# Altium footprint library Selex_PCBLib.PcbLib: 388 footprints (part 13 of 25)
Each footprint in its own frame and in the unit in brackets; x right, y up, seen from the top. Pads: shape width x height; smd on the part's side, far side on the other; paste and mask are expansions set on the pad; w line width, h text height; cw(c..) or ccw(c..) is an arc to the next point about the centre after c.
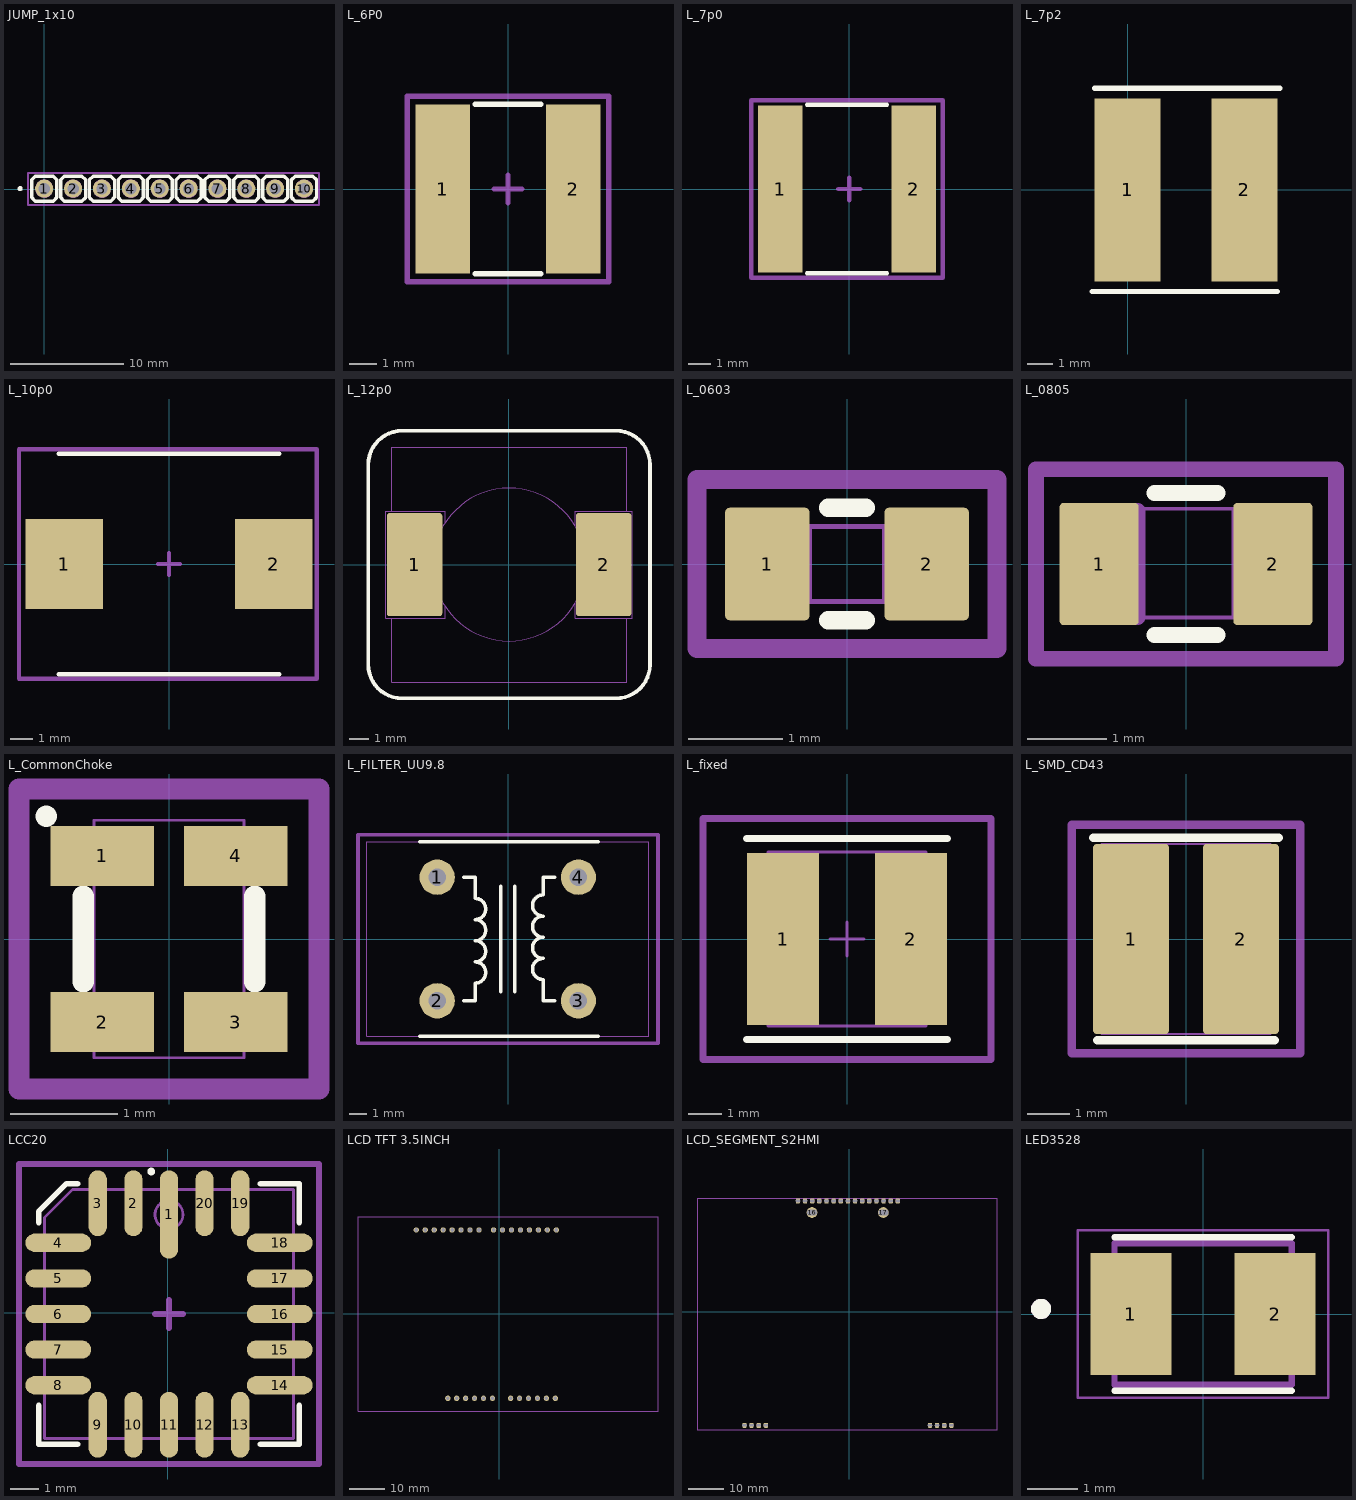
[diagram p12: the footprints below, top view; thin cyan lines are the x and y axes]

## JUMP_1x10 [mm] "JUMP_1x10_2P54"
pads (10):
  round 1.6 hole 1 mask+0.1: 1(0.02,0.03) 2(2.56,0.03) 3(5.1,0.03) 4(7.64,0.03) 5(10.18,0.03) 6(12.72,0.03) 7(15.26,0.03) 8(17.8,0.03) 9(20.34,0.03) 10(22.88,0.03)
Top Overlay:
  circle w0.254: c-2.1,0.03 r0.1
  lines w0.3: -1.08,-0.75 -1.08,0.81 -0.76,1.13 0.8,1.13 1.12,0.81 1.12,-0.75 0.8,-1.07 -0.76,-1.07 -1.08,-0.75 ; 1.46,-0.75 1.46,0.81 1.78,1.13 3.34,1.13 3.66,0.81 3.66,-0.75 3.34,-1.07 1.78,-1.07 1.46,-0.75 ; 4,-0.75 4,0.81 4.32,1.13 5.88,1.13 6.2,0.81 6.2,-0.75 5.88,-1.07 4.32,-1.07 4,-0.75 ; 6.54,-0.75 6.54,0.81 6.86,1.13 8.42,1.13 8.74,0.81 8.74,-0.75 8.42,-1.07 6.86,-1.07 6.54,-0.75 ; 9.08,-0.75 9.08,0.81 9.4,1.13 10.96,1.13 11.28,0.81 11.28,-0.75 10.96,-1.07 9.4,-1.07 9.08,-0.75 ; 11.62,-0.75 11.62,0.81 11.94,1.13 13.5,1.13 13.82,0.81 13.82,-0.75 13.5,-1.07 11.94,-1.07 11.62,-0.75 ; 14.16,-0.75 14.16,0.81 14.48,1.13 16.04,1.13 16.36,0.81 16.36,-0.75 16.04,-1.07 14.48,-1.07 14.16,-0.75 ; 16.7,-0.75 16.7,0.81 17.02,1.13 18.58,1.13 18.9,0.81 18.9,-0.75 18.58,-1.07 17.02,-1.07 16.7,-0.75 ; 19.24,-0.75 19.24,0.81 19.56,1.13 21.12,1.13 21.44,0.81 21.44,-0.75 21.12,-1.07 19.56,-1.07 19.24,-0.75 ; 21.78,-0.75 21.78,0.81 22.1,1.13 23.66,1.13 23.98,0.81 23.98,-0.75 23.66,-1.07 22.1,-1.07 21.78,-0.75
Mechanical 1:
  circle w0.05: c22.88,0.03 r0.762
  circle w0.05: c20.34,0.03 r0.762
  circle w0.05: c17.8,0.03 r0.762
  circle w0.05: c15.26,0.03 r0.762
  circle w0.05: c12.72,0.03 r0.762
  circle w0.05: c10.18,0.03 r0.762
  circle w0.05: c7.64,0.03 r0.762
  circle w0.05: c5.1,0.03 r0.762
  circle w0.05: c2.56,0.03 r0.762
  circle w0.05: c0.02,0.03 r0.762
  lines w0.05: -1.08,-0.75 -0.76,-1.07 0.8,-1.07 1.12,-0.75 1.12,0.81 0.8,1.13 -0.76,1.13 -1.08,0.81 ; 1.46,-0.75 1.78,-1.07 3.34,-1.07 3.66,-0.75 3.66,0.81 3.34,1.13 1.78,1.13 1.46,0.81 1.46,-0.75 ; 4,-0.75 4.32,-1.07 5.88,-1.07 6.2,-0.75 6.2,0.81 5.88,1.13 4.32,1.13 4,0.81 4,-0.75 ; 6.54,-0.75 6.86,-1.07 8.42,-1.07 8.74,-0.75 8.74,0.81 8.42,1.13 6.86,1.13 6.54,0.81 6.54,-0.75 ; 9.08,-0.75 9.4,-1.07 10.96,-1.07 11.28,-0.75 11.28,0.81 10.96,1.13 9.4,1.13 9.08,0.81 9.08,-0.75 ; 11.62,-0.75 11.94,-1.07 13.5,-1.07 13.82,-0.75 13.82,0.81 13.5,1.13 11.94,1.13 11.62,0.81 11.62,-0.75 ; 14.16,-0.75 14.48,-1.07 16.04,-1.07 16.36,-0.75 16.36,0.81 16.04,1.13 14.48,1.13 14.16,0.81 14.16,-0.75 ; 16.7,-0.75 17.02,-1.07 18.58,-1.07 18.9,-0.75 18.9,0.81 18.58,1.13 17.02,1.13 16.7,0.81 16.7,-0.75 ; 19.24,-0.75 19.56,-1.07 21.12,-1.07 21.44,-0.75 21.44,0.81 21.12,1.13 19.56,1.13 19.24,0.81 19.24,-0.75 ; 21.78,-0.75 22.1,-1.07 23.66,-1.07 23.98,-0.75 23.98,0.81 23.66,1.13 22.1,1.13 21.78,0.81 21.78,-0.75
  text "7" at 15.08,-0.47 h0.8
  text "5" at 9.98,-0.37 h0.8
  text "1" at -0.1,-0.37 h0.8
  text "2" at 2.3,-0.37 h0.8
  text "3" at 4.88,-0.37 h0.8
  text "4" at 7.38,-0.37 h0.8
  text "6" at 12.45,-0.42 h0.8
  text "9" at 20.08,-0.47 h0.8
  text "8" at 17.48,-1.57 h0.8
  text "10" at 22.38,-0.27 h0.6
Mechanical 15:
  lines w0.2: -1.4,-1.4 -1.4,1.4 24.2,1.4 24.2,-1.4 -1.4,-1.4
3D body "HEADER1.step": height 5.94, standoff -2.94, extent 21.58,-1.27 24.12,1.27
3D body "HEADER1.step": height 5.94, standoff -2.94, extent 19.04,-1.27 21.58,1.27
3D body "HEADER1.step": height 5.94, standoff -2.94, extent 16.5,-1.27 19.04,1.27
3D body "HEADER1.step": height 5.94, standoff -2.94, extent 13.96,-1.27 16.5,1.27
3D body "HEADER1.step": height 5.94, standoff -2.94, extent 11.42,-1.27 13.96,1.27
3D body "HEADER1.step": height 5.94, standoff -2.94, extent 8.88,-1.27 11.42,1.27
3D body "HEADER1.step": height 5.94, standoff -2.94, extent 6.34,-1.27 8.88,1.27
3D body "HEADER1.step": height 5.94, standoff -2.94, extent 3.8,-1.27 6.34,1.27
3D body "HEADER1.step": height 5.94, standoff -2.94, extent 1.26,-1.27 3.8,1.27
3D body "HEADER1.step": height 5.94, standoff -2.94, extent -1.28,-1.27 1.26,1.27

## L_6P0 [mm] "L_6P0*6P0"
pads (2):
  rect 2x6.2 smd mask+0.075: 1(-2.4,0) 2(2.4,0)
Top Overlay:
  lines w0.2: -1.2,-3.1 1.2,-3.1 ; -1.2,3.1 1.2,3.1
Mechanical 15:
  lines w0.2: -0.5,0 0.5,0 ; 0,-0.5 0,0.5 ; -3.7,-3.4 -3.7,3.4 3.7,3.4 3.7,-3.4 -3.7,-3.4
3D body "IND_TAIYO_NRS6028_TAY.step": height 2.79, standoff 0, extent -3.099,-3.101 3.099,3.101

## L_7p0 [mm] "L_7p0x8p0"
pads (2):
  rect 2x7.5 smd mask+0.075: 1(-3.1,0) 2(2.9,0)
Top Overlay:
  lines w0.2: -1.9,-3.8 1.7,-3.8 ; -1.9,3.8 1.7,3.8
Mechanical 15:
  lines w0.2: -0.5,0 0.5,0 ; 0,-0.5 0,0.5 ; -4.4,-4 4.2,-4 4.2,4 -4.4,4 -4.4,-4
3D body "SMD_Inductor_CD73.step": height 3.65, standoff -0.01, extent -4,-3.5 3.8,3.5

## L_7p2 [mm] "7.2mm x 7.2mm"
pads (2):
  rect 2.6x7.2 smd: 1(0,0) 2(4.6,0)
Top Overlay:
  lines w0.2: -1.4,-4 5.9,-4 ; -1.3,4 6,4
Internal Plane 13:
  lines w0.2: -2.018,-4.216 6.618,-4.216 6.618,4.293 -2.018,4.293 -2.018,2.54 -2.018,-4.216
3D body: height 4, standoff 0, extent -1.524,-3.81 6.096,3.81

## L_10p0 [mm] "10mm x10mm"
pads (2):
  rect 3.5x4.1 smd mask+0.075: 1(-4.75,0) 2(4.75,0)
Top Overlay:
  lines w0.2: -5,-5 5,-5 ; -5,5 5,5
Mechanical 15:
  lines w0.2: -0.5,0 0.5,0 ; 0,-0.5 0,0.5 ; -6.8,-5.2 6.7,-5.2 6.7,5.2 -2.3,5.2 -6.8,5.2 -6.8,0.7 -6.8,-5.2
3D body "CDRH104R.STEP": height 3.8, standoff 0, extent -5.05,-4.95 5.05,4.95

## L_12p0 [mm] "Inductor 12x12x8"
pads (2):
  rrect10% 2.9x5.4 smd: 1(-4.94,0.02) 2(4.96,0.02)
Top Overlay:
  lines w0.2: -7.359,-5.211 ccw(c-5.59,-5.211) -5.59,-6.98 5.61,-6.98 ccw(c5.61,-5.211) 7.379,-5.211 7.379,5.251 ccw(c5.61,5.251) 5.61,7.02 -5.59,7.02 ccw(c-5.59,5.251) -7.359,5.251 -7.359,-5.211
Internal Plane 13:
  lines w0.2: -7.9,-7.3 7.8,-7.3 7.8,7.4 -7.9,7.4 ; -7.818,-7.3 -7.818,-0.76 -7.818,7.4
Mechanical 1:
  circle w0.05: c0.01,0.02 r4
  lines w0.05: -6.14,-2.78 -6.14,-6.13 6.16,-6.13 6.16,-2.78 ; -6.14,2.82 -6.14,6.17 6.16,6.17 6.16,2.82 ; -3.34,-2.18 -3.34,-2.78 -6.44,-2.78 -6.44,2.82 -3.34,2.82 -3.34,2.22 ; 3.46,-1.98 3.46,-2.78 6.46,-2.78 6.46,2.82 3.46,2.82 3.46,2.02
3D body "inductor12x12x8.step": height 8, standoff 0, extent -5.99,-5.98 6.01,6.02

## L_0603 [mm]
pads (2):
  rrect10% 0.9x1.2 smd mask+0.1: 1(-0.85,0)
  rrect10% 0.9x1.2 smd: 2(0.85,0)
Top Overlay:
  lines w0.2: -0.2,-0.6 0.2,-0.6 ; -0.2,0.6 0.2,0.6
Mechanical 1:
  lines w0.05: -0.4,-0.4 -0.4,0.4 ; 0.4,-0.4 0.4,0.4 ; -0.8,-0.4 -0.8,0.4 0.8,0.4 0.8,-0.4 -0.8,-0.4
Mechanical 15:
  lines w0.2: -1.6,-0.9 -1.6,0.9 1.6,0.9 1.6,-0.9 -1.6,-0.9
3D body "L0603C22NJRMST.STEP": height 0.9, standoff 0.1, extent -0.8,-0.55 0.8,0.4

## L_0805 [mm] "Inductor 0805"
pads (2):
  rrect10% 1x1.55 smd mask+0.1: 1(-1.1,0) 2(1.1,0)
Top Overlay:
  lines w0.2: -0.4,-0.9 0.4,-0.9 ; -0.4,0.9 0.4,0.9
Mechanical 1:
  lines w0.05: 0.6,-0.66 0.6,0.675 ; -1.1,-0.675 -1.1,0.7 1.1,0.7 1.1,-0.675 -1.1,-0.675
  lines w0.2: -0.61,-0.675 -0.61,0.675
Mechanical 15:
  lines w0.2: -1.9,-1.2 -1.9,1.2 1.9,1.2 1.9,-1.2 -1.9,-1.2
3D body "CAP0805.step": height 0.73, standoff -0.03, extent -1,-0.655 1,0.655

## L_CommonChoke [mil] "Inductor choke"
pads (4):
  rect 38x22 smd paste+0 mask+0: 1(-24.5,30.5) 2(-24.5,-30.5) 3(24.5,-30.5) 4(24.5,30.5)
Top Overlay:
  lines w7.87: -45,44.95 ccw(c-48,45) -45,45 ; -31.5,-15.75 -31.5,15.75 ; 31.5,-15.75 31.5,15.75
Mechanical 13:
  lines w1: -27.5,-43.5 27.5,-43.5 27.5,43.5 -27.5,43.5 -27.5,-43.5
Mechanical 15:
  lines w7.87: -55,-55 55,-55 55,55 -55,55 -55,-55
3D body "IND_BOURNS_SRF2012A.step": height 55.12, standoff 0, extent -27.48,-43.5 27.48,43.51

## L_FILTER_UU9.8 [mm] "Inductor filter UU9.8"
pads (4):
  round 2 hole 1 mask+0.05: 1(-4.01,3.5) 2(-4.01,-3.5) 3(3.99,-3.5) 4(3.99,3.5)
Top Overlay:
  lines w0.2: -5,-5.5 5.1,-5.5 ; -5,5.5 5.1,5.5 ; -2.51,-3.5 -1.86,-3.5 -1.86,-2.5 ccw(c-1.86,-1.9) -1.86,-1.3 ccw(c-1.86,-0.7) -1.86,-0.1 ccw(c-1.86,0.5) -1.86,1.1 ccw(c-1.86,1.7) -1.86,2.3 -1.86,3.5 -2.51,3.5 ; -0.41,-3 -0.41,3 ; 0.39,-3 0.39,3 ; 2.64,-3.5 1.99,-3.5 1.99,-2.3 cw(c1.99,-1.7) 1.99,-1.1 cw(c1.99,-0.5) 1.99,0.1 cw(c1.99,0.7) 1.99,1.3 cw(c1.99,1.9) 1.99,2.5 1.99,3.5 2.64,3.5
Mechanical 1:
  lines w0.05: -4.01,5.5 -8.01,5.5 ; -8.01,5.5 -8.01,-5.5 7.99,-5.5 7.99,5.5 -8.01,5.5
Mechanical 15:
  lines w0.2: -8.5,-5.9 -8.5,5.9 8.5,5.9 8.5,-5.9 -8.5,-5.9
3D body "User Library-UF9_8.step": height 15.3, standoff -3, extent -8.136,-5.3 8.021,5.3

## L_fixed [mm] "inductor 3.3uH/3A, L_fixed_5P0X5P0"
pads (2):
  rect 2.15x5.15 smd: 1(-1.905,0) 2(1.905,0)
Top Overlay:
  lines w0.2: -3,-3 3,-3 ; -3,3 3,3
Mechanical 13:
  lines w0.1: -2.35,-2.587 -2.35,2.588 -2.337,2.6 2.35,2.6 2.35,-2.6 -2.337,-2.6 -2.35,-2.587
Mechanical 15:
  lines w0.1: -0.5,0 0.5,0 ; 0,-0.5 0,0.5
  lines w0.2: -4.3,-3.6 4.3,-3.6 4.3,3.6 -4.3,3.6 -4.3,-3.6
3D body: height 4, standoff 0, extent -2.25,-2.25 2.25,2.249
3D body: height 1.34, standoff 0, extent -2.35,-2.6 2.35,2.6

## L_SMD_CD43 [mm] "Inductor SMD CD43"
pads (2):
  rrect10% 1.8x4.5 smd mask+0.05: 1(-1.3,0) 2(1.3,0)
Top Overlay:
  lines w0.2: -2.2,2.4 2.2,2.4 ; -2.1,-2.4 2.1,-2.4
Mechanical 1:
  lines w0.05: -2,-2.25 2,-2.25 2,2.25 -2,2.25 -2,-2.25
Mechanical 15:
  lines w0.2: -2.7,-2.7 -2.7,2.7 2.7,2.7 2.7,-2.7 -2.7,-2.7
3D body "User Library-CD43NP.step": height 3.5, standoff 0, extent -2.388,-2.1 2.413,2.2

## LCC20 [mm] "LCC20_1P27-6P35"
pads (20):
  oval 0.65x3.15 smd: 1(0.042,3.512)
  oval 0.65x2.35 smd: 2(-1.228,3.912) 3(-2.498,3.912) 9(-2.498,-3.988) 10(-1.228,-3.988) 11(0.042,-3.988) 12(1.312,-3.988) 13(2.582,-3.988) 19(2.582,3.912) 20(1.312,3.912)
  oval 2.35x0.65 smd: 4(-3.908,2.502) 5(-3.908,1.232) 6(-3.908,-0.038) 7(-3.908,-1.308) 8(-3.908,-2.578) 14(3.992,-2.578) 15(3.992,-1.308) 16(3.992,-0.038) 17(3.992,1.232) 18(3.992,2.502)
Top Overlay:
  circle w0.25: c-0.593,5.042 r0.015
  lines w0.2: -4.608,-3.303 -4.608,-4.688 -3.223,-4.688 ; -4.608,3.227 -4.608,3.612 -3.608,4.612 -3.223,4.612 ; 3.307,-4.688 4.692,-4.688 4.692,-3.303 ; 3.307,4.612 4.692,4.612 4.692,3.227
Mechanical 13:
  circle w0.1: c0.042,3.507 r0.5
  lines w0.1: -4.403,-4.483 -4.403,3.407 -3.403,4.407 4.487,4.407 4.487,-4.483 -4.403,-4.483
Mechanical 15:
  lines w0.2: -0.458,-0.038 0.542,-0.038 ; 0.042,-0.538 0.042,0.462 ; -5.308,-5.388 -5.308,5.312 5.392,5.312 5.392,-5.388 -5.308,-5.388
3D body "User Library-AD827.STEP": height 2.5, standoff -0.05, extent -4.403,-4.483 4.487,4.407

## LCD TFT 3.5INCH [mil]
pads (28):
  round 60 hole 40.16: 1(-925.8,937.43) 2(-825.8,937.43) 3(-725.8,937.43) 4(-625.8,937.43) 5(-525.8,937.43) 6(-425.8,937.43) 7(-325.8,937.43) 8(-225.8,937.43) 9(-63.2,937.43) 10(36.8,937.43) 11(136.8,937.43) 12(236.8,937.43) 13(336.8,937.43) 14(436.8,937.43) 15(536.8,937.43) 16(636.8,937.43) 17(626.56,-940.13) 18(526.56,-940.13) 19(426.56,-940.13) 20(326.56,-940.13) 21(226.56,-940.13) 22(126.56,-940.13) 23(-75.41,-940.13) 24(-175.41,-940.13) 25(-275.41,-940.13) 26(-375.41,-940.13) 27(-475.41,-940.13) 28(-572.65,-940.13)
Internal Plane 1:
  lines w3.94: -1533.95,-1040.69 1533.05,1040.31 ; -1533.95,1041.31 1533.05,-1040.69
Mechanical 7:
  lines w7.87: -1575.41,-1082.69 -1575.41,1082.66 1771.05,1082.66 1771.05,-1082.69 -1575.41,-1082.69
3D body "61300611821.stp": height 335.04, standoff -121.65, extent 67.59,-990.69 687.28,-892.27
3D body: height 511.81, standoff 433.07, extent -1575.41,-1082.69 1771.05,1083.31
3D body "61300611821.stp": height 335.04, standoff -121.65, extent -633.41,-989.69 -13.72,-891.27
3D body "61300811821.stp": height 335.04, standoff -121.65, extent -985.64,888.22 -165.95,986.65
3D body "61300811821.stp": height 335.04, standoff -121.65, extent -123.04,888.22 696.65,986.65
3D body: height 590.55, standoff 472.44, extent -1575.41,-1082.69 -1536.04,1082.66
3D body: height 590.55, standoff 511.81, extent -1575.41,-1082.69 1771.05,-1043.32
3D body: height 590.55, standoff 511.81, extent -1575.41,1043.29 1771.05,1082.66
3D body: height 590.55, standoff 511.81, extent 1731.68,885.81 1771.05,1082.66
3D body: height 590.55, standoff 511.81, extent 1731.68,-1082.69 1771.05,-885.84
3D body: height 590.55, standoff 511.81, extent 1536.17,-1042.69 1726.05,1037.31
3D body: height 590.55, standoff 511.81, extent -1533.95,-1040.69 1533.05,1041.31

## LCD_SEGMENT_S2HMI [mm]
pads (26):
  rrect50% 1.2x1.4 hole 0.6 slot 1.2 at 0 deg mask+0.07: 1(13.65,31) 2(11.65,31) 3(9.65,31) 4(7.65,31) 5(5.65,31) 6(3.65,31) 7(1.65,31) 8(-0.35,31) 9(-2.35,31) 10(-4.35,31) 11(-6.35,31) 12(-8.35,31) 13(-10.35,31) 14(-12.354,31) 15(-14.354,31) NM(-29.35,-31.9) NM(-27.35,-31.9) NM(-25.35,-31.9) NM(-23.35,-31.9) NM(22.65,-31.9) NM(24.65,-31.9) NM(26.65,-31.9) NM(28.65,-31.9) ""(7.65,31)
  round 3 hole 1.5 slot 2.7 at 0 deg: 16(-10.4,27.75) 17(9.6,27.75)
Bottom Overlay:
  lines w0.4: -28.35,-32.65 -28.35,-31.15 ; -26.35,-32.65 -26.35,-31.15 ; -24.35,-32.65 -24.35,-31.15 ; -13.354,30.25 -13.354,31.75 ; -11.354,30.25 -11.354,31.75 ; -9.35,30.25 -9.35,31.75 ; -7.35,30.25 -7.35,31.75 ; -5.35,30.25 -5.35,31.75 ; -3.35,30.25 -3.35,31.75 ; -1.35,30.25 -1.35,31.75 ; 0.65,30.25 0.65,31.75 ; 2.65,30.25 2.65,31.75 ; 4.65,30.25 4.65,31.75 ; 6.65,30.25 6.65,31.75 ; 8.65,30.25 8.65,31.75 ; 10.65,30.25 10.65,31.75 ; 12.65,30.25 12.65,31.75 ; 14.65,30.25 14.65,31.75 ; 23.65,-32.65 23.65,-31.15 ; 25.65,-32.65 25.65,-31.15 ; 27.65,-32.65 27.65,-31.15
Mechanical 7:
  lines w0.254: -42.65,-33.15 41.45,-33.15 41.45,-31.9 41.45,31.773 -42.65,31.773 -42.65,-33.15
3D body "Man hinh HMI V3.0.stp": height 5.12, standoff -9.36, extent -43.04,-33.15 42.25,31.78

## LED3528 [mm]
pads (2):
  rect 1.6x2.4 smd: 1(-1.425,0) 2(1.425,0)
Top Overlay:
  circle w0.2: c-3.2,0.1 r0.1
  lines w0.127: -1.75,-1.513 1.75,-1.513 ; -1.75,1.513 1.75,1.513
Mechanical 13:
  circle w0.2: c-3.2,0.1 r0.1
  lines w0.127: -1.75,-1.4 -1.75,1.4 1.75,1.4 1.75,-1.4 -1.75,-1.4
Mechanical 15:
  lines w0.05: -2.475,-1.65 -2.475,1.65 2.475,1.65 2.475,-1.65 -2.475,-1.65
3D body "step_temp.STEP": height 0.75, standoff 0, extent -1.75,-1.4 1.75,1.4